# Altium footprint library EPCOS.PcbLib: 178 footprints (part 1 of 12)
Each footprint in its own frame and in the unit in brackets; x right, y up, seen from the top. Pads: shape width x height; smd on the part's side, far side on the other; paste and mask are expansions set on the pad; w line width, h text height; cw(c..) or ccw(c..) is an arc to the next point about the centre after c.
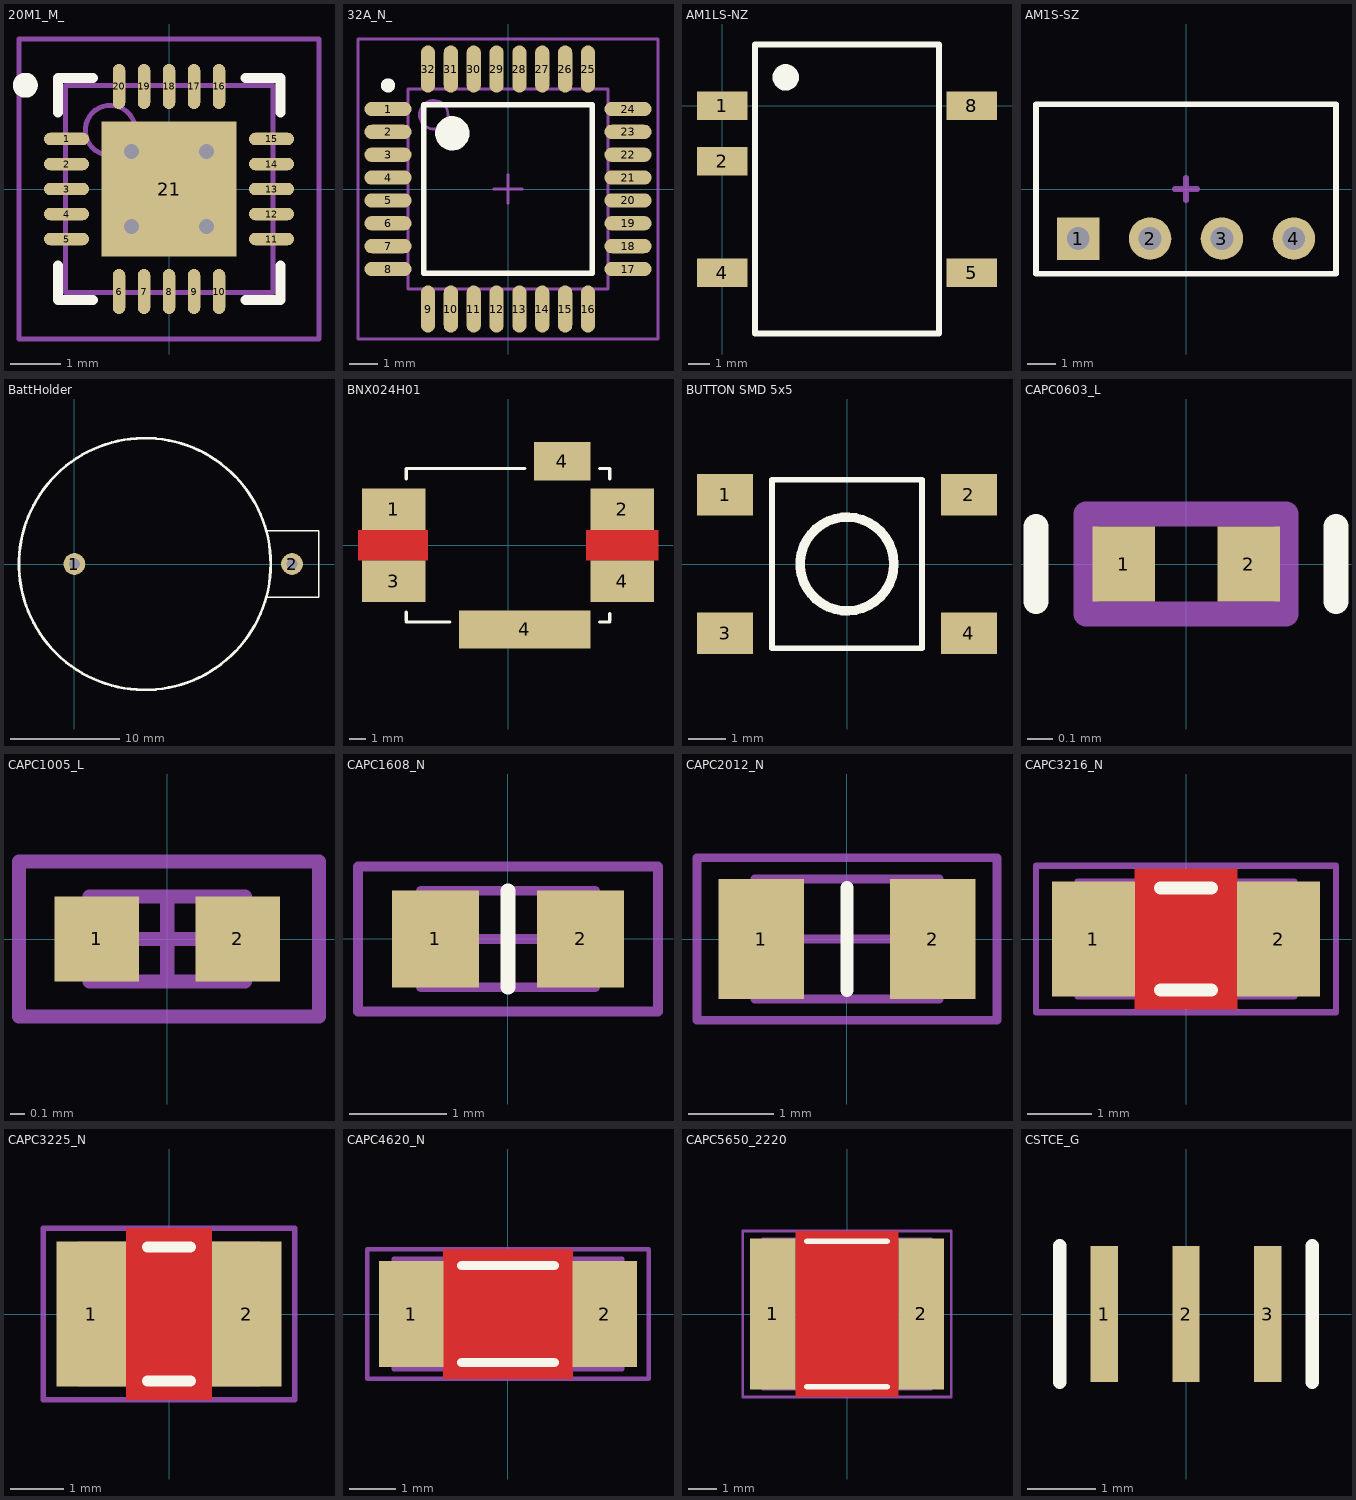
[diagram p0: the footprints below, top view; thin cyan lines are the x and y axes]

## 20M1_M_ [mm] "QFN, 20-Leads, Body 4x4mm, Pitch 0.5mm"
height 0.8
pads (21):
  oval 0.9x0.25 smd: 1(-2.05,1) 2(-2.05,0.5) 3(-2.05,0) 4(-2.05,-0.5) 5(-2.05,-1) 11(2.05,-1) 12(2.05,-0.5) 13(2.05,0) 14(2.05,0.5) 15(2.05,1)
  oval 0.25x0.9 smd: 6(-1,-2.05) 7(-0.5,-2.05) 8(0,-2.05) 9(0.5,-2.05) 10(1,-2.05) 16(1,2.05) 17(0.5,2.05) 18(0,2.05) 19(-0.5,2.05) 20(-1,2.05)
  rect 2.7x2.7 smd: 21(0,0)
via -0.75,0.75 diameter 0.5 hole 0.3
via 0.75,0.75 diameter 0.5 hole 0.3
via -0.75,-0.75 diameter 0.5 hole 0.3
via 0.75,-0.75 diameter 0.5 hole 0.3
Top Overlay:
  circle w0.25: c-2.875,2.075 r0.125
  lines w0.2: -2.225,-1.525 -2.225,-2.225 -1.525,-2.225 ; -2.225,1.525 -2.225,2.225 -1.525,2.225 ; 1.525,-2.225 2.225,-2.225 2.225,-1.525 ; 1.525,2.225 2.225,2.225 2.225,1.525
Mechanical 13:
  circle w0.1: c-1.175,1.175 r0.5
  lines w0.1: -2.075,-2.075 -2.075,2.075 2.075,2.075 2.075,-2.075 -2.075,-2.075
Mechanical 15:
  lines w0.1: -0.5,0 0.5,0 ; 0,-0.5 0,0.5 ; -3,-3 -3,3 3,3 3,-3 -3,-3
3D body "User Library-QFN20_4x4x0_8.step": height 0.78, standoff -0.02, extent -2.01,-2.01 2.01,2.01

## 32A_N_ [mm] "TQFP 32 Body 7x7"
height 1.2
pads (32):
  oval 1.65x0.5 smd: 1(-4.2,2.8) 2(-4.2,2) 3(-4.2,1.2) 4(-4.2,0.4) 5(-4.2,-0.4) 6(-4.2,-1.2) 7(-4.2,-2) 8(-4.2,-2.8) 17(4.2,-2.8) 18(4.2,-2) 19(4.2,-1.2) 20(4.2,-0.4) 21(4.2,0.4) 22(4.2,1.2) 23(4.2,2) 24(4.2,2.8)
  oval 0.5x1.65 smd: 9(-2.8,-4.2) 10(-2,-4.2) 11(-1.2,-4.2) 12(-0.4,-4.2) 13(0.4,-4.2) 14(1.2,-4.2) 15(2,-4.2) 16(2.8,-4.2) 25(2.8,4.2) 26(2,4.2) 27(1.2,4.2) 28(0.4,4.2) 29(-0.4,4.2) 30(-1.2,4.2) 31(-2,4.2) 32(-2.8,4.2)
Top Overlay:
  circle w0.6: c-1.95,1.95 r0.3
  circle w0.25: c-4.2,3.625 r0.125
  lines w0.2: -2.95,-2.95 2.95,-2.95 2.95,2.95 -2.95,2.95 -2.95,-2.95
Mechanical 13:
  circle w0.1: c-2.6,2.6 r0.5
  lines w0.1: -3.5,-3.5 3.5,-3.5 3.5,3.5 -3.5,3.5 -3.5,-3.5
Mechanical 15:
  lines w0.1: -0.5,0 0.5,0 ; 0,-0.5 0,0.5 ; -5.25,-5.25 5.25,-5.25 5.25,5.25 -5.25,5.25 -5.25,-5.25
3D body "User Library-tqfp32.step": height 1.1, standoff -0.01, extent -4.8,-4.8 4.8,4.8

## AM1LS-NZ [mm]
height 7
pads (5):
  rect 2.3x1.3 smd: 1(0,0) 2(0,-2.54) 4(0,-7.62) 5(11.4,-7.62) 8(11.4,0)
Top Overlay:
  circle w0.8: c2.9,1.3 r0.2
  lines w0.254: 1.5,-10.4 1.5,2.8 9.9,2.8 9.9,-10.4 1.5,-10.4
Mechanical 13:
  lines w0.1: 1.5,-10.4 9.9,-10.4 9.9,2.8 1.5,2.8 1.5,-10.4
3D body "User Library-AM1LS-NZ.step": height 7, standoff 0, extent 0.1,-10.15 11.3,2.55

## AM1S-SZ [mm]
height 10.15
pads (4):
  rect 1.5x1.5 hole 0.8: 1(-3.81,-1.75)
  round 1.5 hole 0.8: 2(-1.27,-1.75) 3(1.27,-1.75) 4(3.81,-1.75)
Top Overlay:
  lines w0.2: -5.3,-3 -5.3,3 5.3,3 5.3,-2.9 5.3,-3 -5.3,-3
Mechanical 15:
  lines w0.2: -0.4,0 0.4,0 ; 0,-0.4 0,0.4
3D body "User Library-4-Lead SIP_AM1S-1205SZ_Aimtec_DC-DC_Converter_1_Watt.step": height 10.15, standoff -3.05, extent -5.842,-3 5.842,3

## BattHolder [mm] "CR2032 battery holder"
height 6.985
pads (2):
  round 2 hole 1: 1(0,0) 2(20,0)
Top Overlay:
  circle w0.254: c6.477,0 r11.568
  lines w0.127: 17.653,-3.048 22.479,-3.048 22.479,3.048 17.653,3.048
3D body "User Library-BH-25T.step": height 8.3, standoff -3.7, extent -5.6,-11.5 22.4,11.498

## BNX024H01 [mm]
height 3.5
pads (6):
  rect 3.8x2.5 smd: 1(-6.85,2.15) 2(6.85,2.15) 3(-6.85,-2.15) 4(6.85,-2.15)
  rect 7.9x2.3 smd: 4(1,-5.05)
  rect 3.4x2.3 smd: 4(3.25,5.05)
Top Layer:
  pour cut-out: -9,0.9 -4.8,0.9 -4.8,-0.9 -9,-0.9
  pour cut-out: 4.7,0.9 9,0.9 9,-0.9 4.7,-0.9
Top Overlay:
  lines w0.2: -6.1,-4.6 -3.5,-4.6 ; -6.1,-4.5 -6.1,-4 ; -6.1,4 -6.1,4.6 1,4.6 ; 5.5,-4.6 6.1,-4.6 ; 5.5,4.6 6.1,4.6 6.1,4 ; 6.1,-4.5 6.1,-4.1
3D body "User Library-BNX024.step": height 3.6, standoff 0, extent -6.15,-4.65 6.15,4.65

## BUTTON SMD 5x5 [mm]
height 1.5
pads (4):
  rect 1.5x1.1 smd: 1(-3.25,1.85) 2(3.25,1.85) 3(-3.25,-1.85) 4(3.25,-1.85)
Top Overlay:
  circle w0.254: c0,0 r1.25
  lines w0.15: -2,-2.25 2,-2.25 2,2.25 -2,2.25 -2,-2.25
3D body "User Library-button1.step": height 1.5, standoff 0, extent -3.2,-2.65 3.203,2.65

## CAPC0603_L [mm] "Chip Capacitor, Body 0.6x0.3mm, IPC High Density"
height 0.3
pads (2):
  rect 0.25x0.3 smd: 1(-0.25,0) 2(0.25,0)
Top Overlay:
  lines w0.1: -0.6,-0.15 -0.6,0.15 ; 0.6,-0.15 0.6,0.15
Mechanical 15:
  lines w0.1: -0.4,-0.2 0.4,-0.2 0.4,0.2 -0.4,0.2 -0.4,-0.2
3D body "User Library-0201_Cap.step": height 0.31, standoff 0, extent -0.44,-0.15 0.44,0.15

## CAPC1005_L [mm] "Chip Capacitor, Body 1.1x0.5mm, IPC High Density"
height 0.6
pads (2):
  rect 0.6x0.6 smd: 1(-0.5,0) 2(0.5,0)
Mechanical 13:
  lines w0.1: -0.55,-0.3 -0.55,0.3 0.55,0.3 0.55,-0.3 -0.55,-0.3
Mechanical 15:
  lines w0.1: -0.3,0 0.3,0 ; 0,-0.3 0,0.3 ; -1.05,-0.55 -1.05,0.55 1.075,0.55 1.075,-0.55 -1.05,-0.55
3D body "User Library-Capacitor 0402.step": height 0.49, standoff -0.01, extent -0.5,-0.25 0.5,0.25

## CAPC1608_N [mm]
height 0.85
pads (2):
  rect 0.9x1 smd: 1(-0.75,0) 2(0.75,0)
Top Overlay:
  lines w0.15: 0,-0.5 0,0.5
Mechanical 13:
  lines w0.1: -0.6,-0.5 -0.6,0.5 ; 0.6,-0.5 0.6,0.5 ; -0.9,-0.5 0.9,-0.5 0.9,0.5 -0.9,0.5 -0.9,-0.5
Mechanical 15:
  lines w0.1: -0.475,0 0.475,0 ; 0,-0.475 0,0.475 ; -1.55,-0.75 -1.55,0.75 1.55,0.75 1.55,-0.75 -1.55,-0.75
3D body "User Library-CAPC1608X___.step": height 0.62, standoff 0, extent -0.8,-0.41 0.8,0.41

## CAPC2012_N [mm]
height 1.1
pads (2):
  rect 1x1.4 smd: 1(-1,0) 2(1,0)
Top Overlay:
  lines w0.15: 0,-0.6 0,0.6
Mechanical 13:
  lines w0.1: -0.85,-0.7 -0.85,0.7 ; 0.85,-0.7 0.85,0.7 ; -1.075,-0.7 1.075,-0.7 1.075,0.7 -1.075,0.7 -1.075,-0.7
Mechanical 15:
  lines w0.1: -0.5,0 0.5,0 ; 0,-0.5 0,0.5 ; -1.75,-0.95 1.75,-0.95 1.75,0.95 -1.75,0.95 -1.75,-0.95
3D body "User Library-CAPC2012X___75.step": height 0.77, standoff 0, extent -1,-0.635 1,0.635

## CAPC3216_N [mm]
height 1.35
pads (2):
  rect 1.3x1.8 smd: 1(-1.45,0) 2(1.45,0)
Top Layer:
  pour cut-out: -0.8,1.1 0.8,1.1 0.8,-1.1 -0.8,-1.1
Top Overlay:
  lines w0.2: -0.4,-0.8 0.4,-0.8 ; -0.4,0.8 0.4,0.8
Mechanical 13:
  lines w0.1: -1.25,-0.9 -1.25,0.9 ; 1.25,-0.9 1.25,0.9 ; -1.7,-0.9 -1.7,0.9 1.7,0.9 1.7,-0.9 -1.7,-0.9
Mechanical 15:
  lines w0.1: -0.5,0 0.5,0 ; 0,-0.5 0,0.5 ; -2.35,-1.15 -2.35,1.15 2.35,1.15 2.35,-1.15 -2.35,-1.15
3D body "User Library-CAPC3216X___1.step": height 0.82, standoff 0, extent -1.6,-0.81 1.6,0.81

## CAPC3225_N [mm]
height 1.35
pads (2):
  rect 1.3x2.7 smd: 1(-1.45,0) 2(1.45,0)
Top Layer:
  pour cut-out: -0.8,1.6 0.8,1.6 0.8,-1.6 -0.8,-1.6
Top Overlay:
  lines w0.2: -0.4,-1.25 0.4,-1.25 ; -0.4,1.25 0.4,1.25
Mechanical 13:
  lines w0.1: -1.25,-1.3 -1.25,1.3 ; 1.25,-1.3 1.25,1.3 ; -1.675,-1.3 -1.675,1.3 1.675,1.3 1.675,-1.3 -1.675,-1.3
Mechanical 15:
  lines w0.1: -0.5,0 0.5,0 ; 0,-0.5 0,0.5 ; -2.35,-1.6 -2.35,1.6 2.35,1.6 2.35,-1.6 -2.35,-1.6
3D body "User Library-CAPC3225X___175.step": height 1.72, standoff 0, extent -1.6,-1.26 1.6,1.26

## CAPC4620_N [mm] "Chip Capacitor, Body 4.6x2.0mm, IPC Medium Density"
height 2.03
pads (2):
  rect 1.4x2.3 smd: 1(-2.1,0) 2(2.1,0)
Top Layer:
  pour cut-out: -1.4,1.4 1.4,1.4 1.4,-1.4 -1.4,-1.4
Top Overlay:
  lines w0.2: -1,-1.05 1,-1.05 ; -1,1.05 1,1.05
Mechanical 13:
  lines w0.1: -2.475,-1.2 2.475,-1.2 2.475,1.2 -2.475,1.2 -2.475,-1.2
Mechanical 15:
  lines w0.1: -0.5,0 0.5,0 ; 0,-0.5 0,0.5 ; -3.05,-1.4 3.05,-1.4 3.05,1.4 -3.05,1.4 -3.05,-1.4
3D body "User Library-Ceramic_Capacitor_1808_h63mil.STEP": height 1.61, standoff 0.01, extent -2.25,-1 2.25,1

## CAPC5650_2220 [mm]
height 1.8
pads (2):
  rect 1.6x5.3 smd: 1(-2.6,0) 2(2.6,0)
Top Layer:
  pour cut-out: -1.8,2.9 1.8,2.9 1.8,-2.9 -1.8,-2.9
Top Overlay:
  lines w0.2: -1.4,-2.55 1.4,-2.55 ; -1.4,2.55 1.4,2.55
Mechanical 13:
  lines w0.1: -1.95,-2.625 -1.95,2.625 ; 1.95,-2.625 1.95,2.625 ; -2.95,-2.625 -2.95,2.625 2.95,2.625 2.95,-2.625 -2.95,-2.625
Mechanical 15:
  lines w0.1: -0.5,0 0.5,0 ; 0,-0.5 0,0.5 ; -3.65,-2.9 -3.65,2.9 3.65,2.9 3.65,-2.9 -3.65,-2.9
3D body "User Library-CAPC5650X___175.step": height 1.77, standoff 0, extent -2.85,-2.51 2.85,2.51

## CSTCE_G [mm]
height 0.7
pads (3):
  rect 0.4x2 smd: 1(-1.2,0) 2(0,0) 3(1.2,0)
Top Overlay:
  lines w0.2: -1.85,-1 -1.85,1 ; 1.85,-1 1.85,1
3D body "User Library-CSTCE.step": height 0.7, standoff 0, extent -1.6,-0.65 1.6,0.65